# Altium footprint library CAP_TH.PcbLib: 219 footprints (part 9 of 14)
Each footprint in its own frame and in the unit in brackets; x right, y up, seen from the top. Pads: shape width x height; smd on the part's side, far side on the other; paste and mask are expansions set on the pad; w line width, h text height; cw(c..) or ccw(c..) is an arc to the next point about the centre after c.
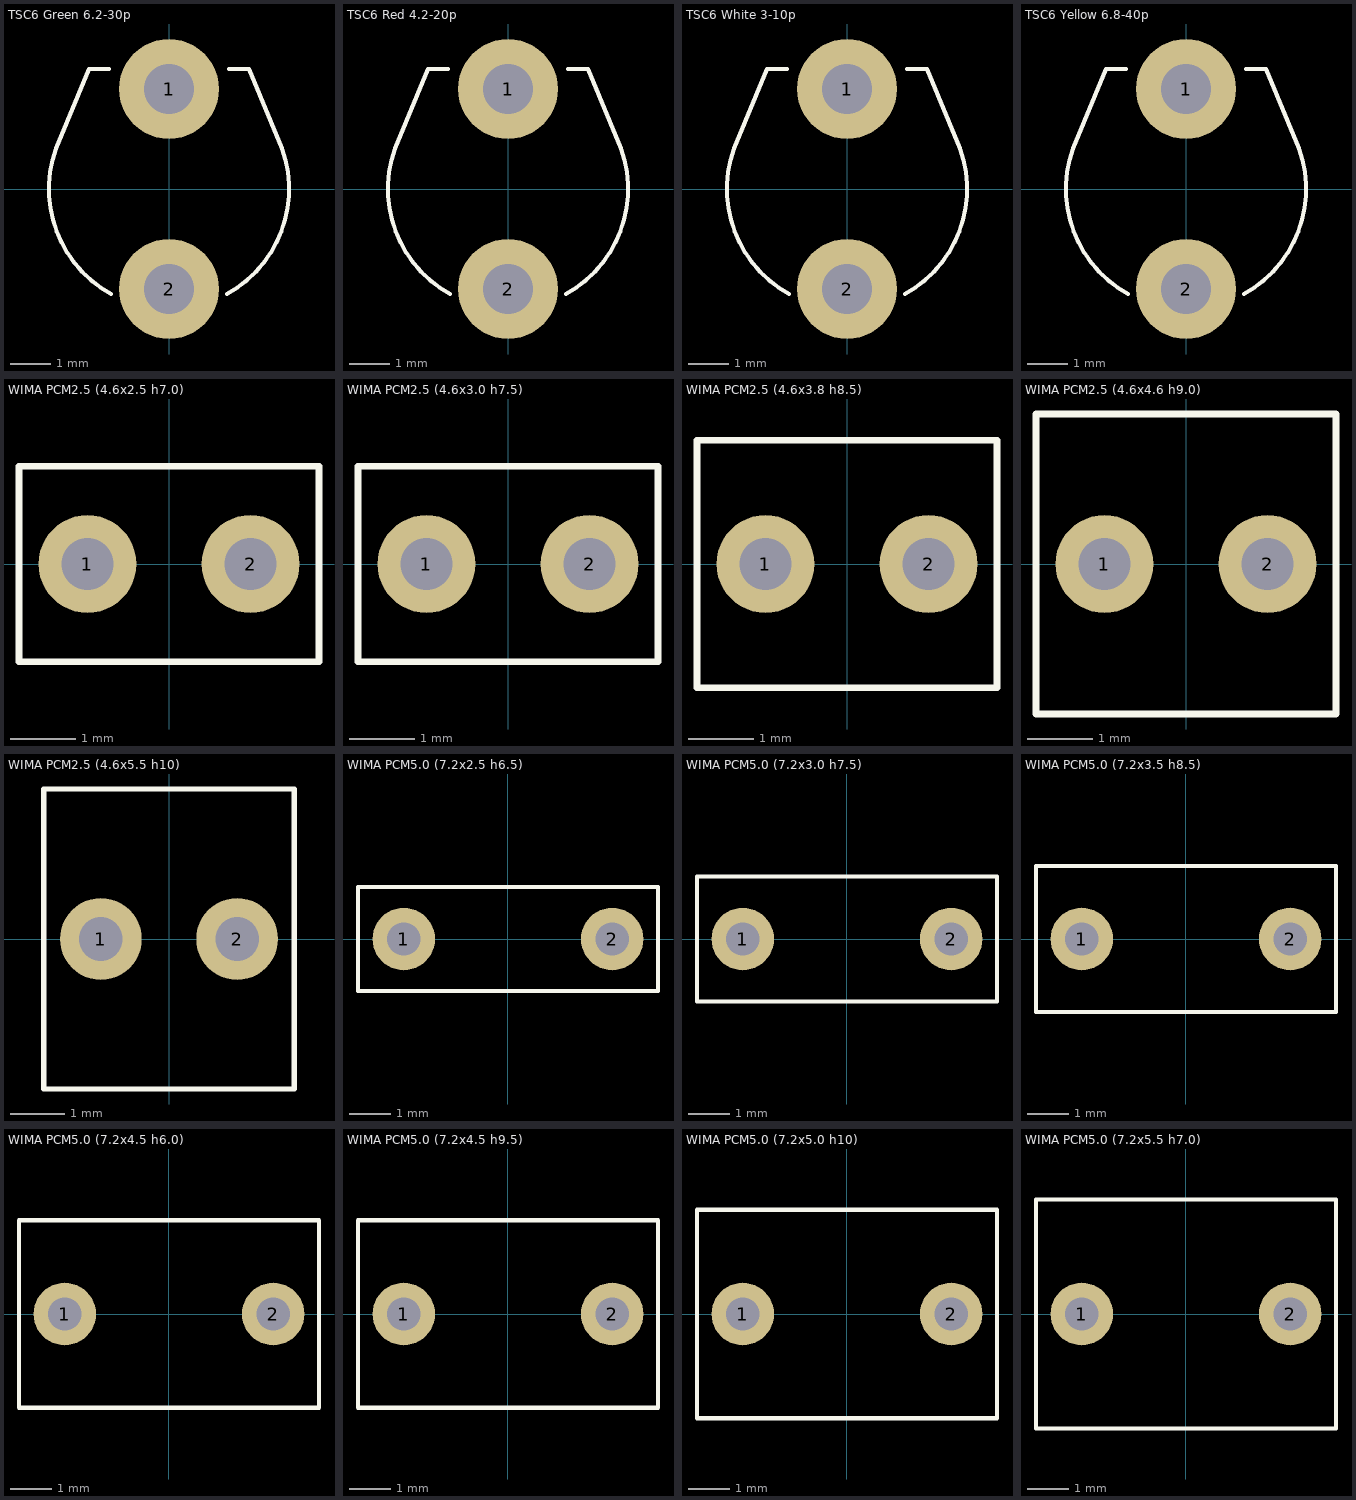
[diagram p8: the footprints below, top view; thin cyan lines are the x and y axes]

## TSC6 Green 6.2-30p [mm]
pads (2):
  round 2.5 hole 1.25: 1(0,2.5) 2(0,-2.5)
Top Overlay:
  lines w0.1: -1.5,3 -2,3 -2.824,1.011 ccw(c0,0) -1.454,-2.624 ; 1.454,-2.624 ccw(c0,0) 2.824,1.011 2,3 1.5,3
3D body "TSC6 Green 6.2-30p.STEP": height 4.8, standoff -2.11, extent -3,-3 3,3

## TSC6 Red 4.2-20p [mm]
pads (2):
  round 2.5 hole 1.25: 1(0,2.5) 2(0,-2.5)
Top Overlay:
  lines w0.1: -1.5,3 -2,3 -2.824,1.011 ccw(c0,0) -1.454,-2.624 ; 1.454,-2.624 ccw(c0,0) 2.824,1.011 2,3 1.5,3
3D body "TSC6 Red 4.2-20p.STEP": height 4.8, standoff -2.11, extent -3,-3 3,3

## TSC6 White 3-10p [mm]
pads (2):
  round 2.5 hole 1.25: 1(0,2.5) 2(0,-2.5)
Top Overlay:
  lines w0.1: -1.5,3 -2,3 -2.824,1.011 ccw(c0,0) -1.454,-2.624 ; 1.454,-2.624 ccw(c0,0) 2.824,1.011 2,3 1.5,3
3D body "TSC6 White 3-10p.STEP": height 4.8, standoff -2.11, extent -3,-3 3,3

## TSC6 Yellow 6.8-40p [mm]
pads (2):
  round 2.5 hole 1.25: 1(0,2.5) 2(0,-2.5)
Top Overlay:
  lines w0.1: -1.5,3 -2,3 -2.824,1.011 ccw(c0,0) -1.454,-2.624 ; 1.454,-2.624 ccw(c0,0) 2.824,1.011 2,3 1.5,3
3D body "TSC6 Yellow 6.8-40p.STEP": height 4.8, standoff -2.11, extent -3,-3 3,3

## WIMA PCM2.5 (4.6x2.5 h7.0) [mm]
pads (2):
  round 1.5 hole 0.8: 1(-1.25,0) 2(1.25,0)
Top Overlay:
  lines w0.1: -2.3,-1.5 2.3,-1.5 2.3,1.5 -2.3,1.5 -2.3,-1.5
3D body "WIMA PCM2.5 (4.6x2.5 h7.0).STEP": height 7.5, standoff -2, extent -2.3,-1.5 2.3,1.5

## WIMA PCM2.5 (4.6x3.0 h7.5) [mm]
pads (2):
  round 1.5 hole 0.8: 1(-1.25,0) 2(1.25,0)
Top Overlay:
  lines w0.1: -2.3,-1.5 -2.3,1.5 2.3,1.5 2.3,-1.5 -2.3,-1.5
3D body "WIMA PCM2.5 (4.6x3.0 h7.5).STEP": height 7.5, standoff -2, extent -2.3,-1.5 2.3,1.5

## WIMA PCM2.5 (4.6x3.8 h8.5) [mm]
pads (2):
  round 1.5 hole 0.8: 1(-1.25,0) 2(1.25,0)
Top Overlay:
  lines w0.1: -2.3,-1.9 -2.3,1.9 2.3,1.9 2.3,-1.9 -2.3,-1.9
3D body "WIMA PCM2.5 (4.6x3.8 h8.5).STEP": height 8.5, standoff -2, extent -2.3,-1.9 2.3,1.9

## WIMA PCM2.5 (4.6x4.6 h9.0) [mm]
pads (2):
  round 1.5 hole 0.8: 1(-1.25,0) 2(1.25,0)
Top Overlay:
  lines w0.1: -2.3,-2.3 2.3,-2.3 2.3,2.3 -2.3,2.3 -2.3,-2.3
3D body "WIMA PCM2.5 (4.6x4.6 h9.0).STEP": height 9, standoff -2, extent -2.3,-2.3 2.3,2.3

## WIMA PCM2.5 (4.6x5.5 h10) [mm]
pads (2):
  round 1.5 hole 0.8: 1(-1.25,0) 2(1.25,0)
Top Overlay:
  lines w0.1: -2.3,-2.75 2.3,-2.75 2.3,2.75 -2.3,2.75 -2.3,-2.75
3D body "WIMA PCM2.5 (4.6x5.5 h10).STEP": height 10, standoff -2, extent -2.3,-2.75 2.3,2.75

## WIMA PCM5.0 (7.2x2.5 h6.5) [mm]
pads (2):
  round 1.5 hole 0.8: 1(-2.5,0) 2(2.5,0)
Top Overlay:
  lines w0.1: -3.6,-1.25 3.6,-1.25 3.6,1.25 -3.6,1.25 -3.6,-1.25
3D body "WIMA PCM5.0 (7.2x2.5 h6.5).STEP": height 7, standoff -2, extent -3.6,-1.25 3.6,1.25

## WIMA PCM5.0 (7.2x3.0 h7.5) [mm]
pads (2):
  round 1.5 hole 0.8: 1(-2.5,0) 2(2.5,0)
Top Overlay:
  lines w0.1: -3.6,-1.5 3.6,-1.5 3.6,1.5 -3.6,1.5 -3.6,-1.5
3D body "WIMA PCM5.0 (7.2x3.0 h7.5).STEP": height 7.5, standoff -2, extent -3.6,-1.5 3.6,1.5

## WIMA PCM5.0 (7.2x3.5 h8.5) [mm]
pads (2):
  round 1.5 hole 0.8: 1(-2.5,0) 2(2.5,0)
Top Overlay:
  lines w0.1: -3.6,-1.75 3.6,-1.75 3.6,1.75 -3.6,1.75 -3.6,-1.75
3D body "WIMA PCM5.0 (7.2x3.5 h8.5).STEP": height 8.5, standoff -2, extent -3.6,-1.75 3.6,1.75

## WIMA PCM5.0 (7.2x4.5 h6.0) [mm]
pads (2):
  round 1.5 hole 0.8: 1(-2.5,0) 2(2.5,0)
Top Overlay:
  lines w0.1: -3.6,-2.25 -3.6,2.25 3.6,2.25 3.6,-2.25 -3.6,-2.25
3D body "WIMA PCM5.0 (7.2x4.5 h6.0).STEP": height 6, standoff -2, extent -3.6,-2.25 3.6,2.25

## WIMA PCM5.0 (7.2x4.5 h9.5) [mm]
pads (2):
  round 1.5 hole 0.8: 1(-2.5,0) 2(2.5,0)
Top Overlay:
  lines w0.1: -3.6,-2.25 3.6,-2.25 3.6,2.25 -3.6,2.25 -3.6,-2.25
3D body "WIMA PCM5.0 (7.2x4.5 h9.5).STEP": height 9.5, standoff -2, extent -3.6,-2.25 3.6,2.25

## WIMA PCM5.0 (7.2x5.0 h10) [mm]
pads (2):
  round 1.5 hole 0.8: 1(-2.5,0) 2(2.5,0)
Top Overlay:
  lines w0.1: -3.6,-2.5 3.6,-2.5 3.6,2.5 -3.6,2.5 -3.6,-2.5
3D body "WIMA PCM5.0 (7.2x5.0 h10).STEP": height 10, standoff -2, extent -3.6,-2.5 3.6,2.5

## WIMA PCM5.0 (7.2x5.5 h7.0) [mm]
pads (2):
  round 1.5 hole 0.8: 1(-2.5,0) 2(2.5,0)
Top Overlay:
  lines w0.1: -3.6,-2.75 -3.6,2.75 3.6,2.75 3.6,-2.75 -3.6,-2.75
3D body "WIMA PCM5.0 (7.2x5.5 h7.0).STEP": height 7, standoff -2, extent -3.6,-2.75 3.6,2.75